# Altium footprint library ACTION_Others.pcblib: 88 footprints (part 5 of 6)
Each footprint in its own frame and in the unit in brackets; x right, y up, seen from the top. Pads: shape width x height; smd on the part's side, far side on the other; paste and mask are expansions set on the pad; w line width, h text height; cw(c..) or ccw(c..) is an arc to the next point about the centre after c.
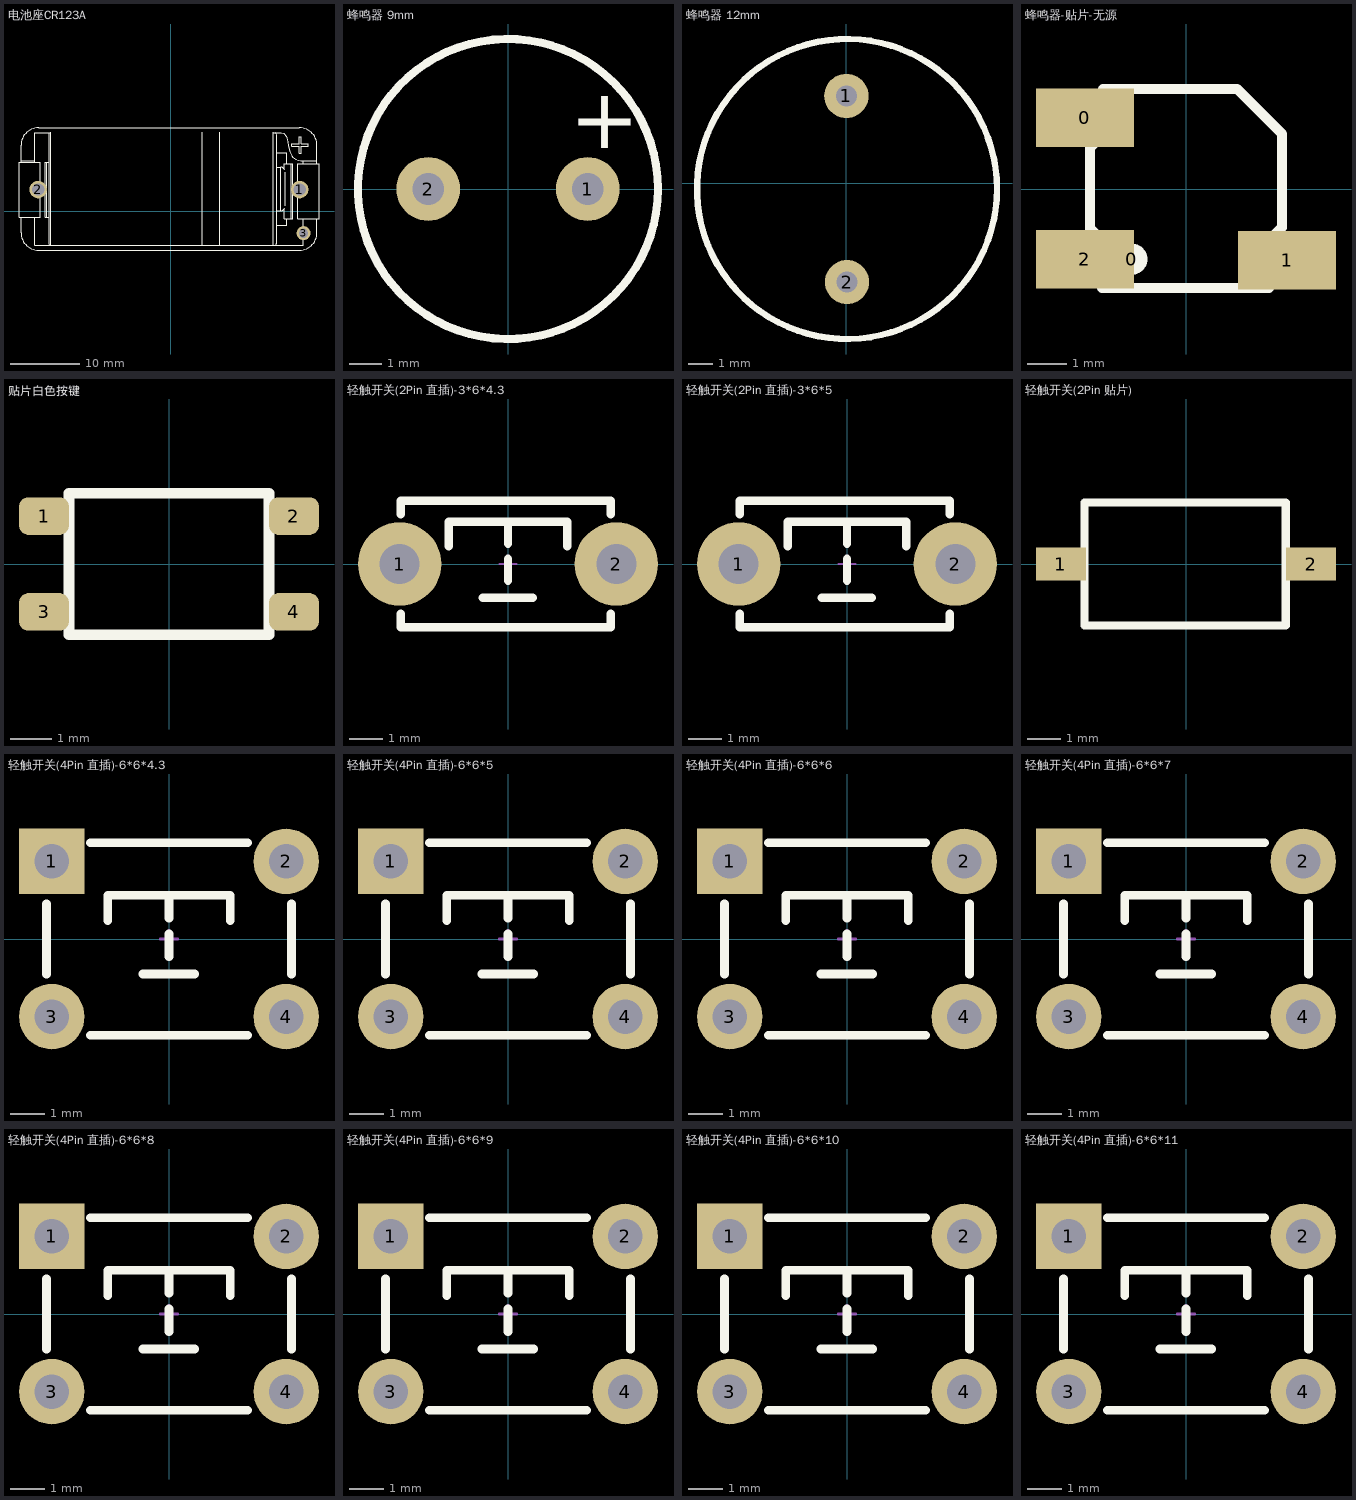
[diagram p4: the footprints below, top view; thin cyan lines are the x and y axes]

## 电池座CR123A [mil]
pads (3):
  round 100 hole 70: 1(736,124.5) 2(-758,124.5)
  round 80 hole 53: 3(758,-124.5)
Top Overlay:
  lines w2.13: -855.83,-33.25 -855.83,-122.24 ccw(c-755.83,-122.24) -755.83,-222.24 734.17,-222.24 ccw(c734.17,-122.24) 834.17,-122.24 834.17,-42.06 ; -855.83,281.71 -855.83,289.53 ; -777.09,-33.25 -777.09,-194.68 755.43,-194.68 755.43,-42.06 ; -777.09,281.71 -777.09,289.53 ; -695.79,-189.56 ccw(c-685.79,-189.56) -694.38,-194.68 ; -695.79,-188.34 -695.79,445.44 cw(c-685.79,445.44) -694.59,450.2 ; -695.79,-33.25 -710.23,-33.25 ; -695.79,281.71 -710.23,281.71 ; -688.43,450.2 -777.09,450.2 -777.09,289.53 ; -685.79,-194.68 -685.79,450.56 ; 179.21,-194.68 179.21,450.56 ; 279.21,-194.68 279.21,450.56 ; 584.21,-194.68 584.21,450.56 ; 587.96,450.2 630.12,450.2 643.3,445.11 649.03,440.86 653.89,435.62 658.53,428.24 661.99,420.21 667.88,398.32 671.65,375.83 675.7,353.41 679.04,340.54 683.73,328.13 688.92,318.82 695.56,310.49 703.64,303.49 712.81,297.96 726.4,292.74 740.67,289.66 755.43,288.19 ; 597.3,-194.68 ccw(c584.21,-179.56) 604.21,-179.56 ; 597.7,450.2 cw(c584.21,435.44) 604.21,435.44 604.21,-178.38 ; 604.21,-78.97 660.78,-78.97 660.78,-42.06 ; 604.21,2.94 627.21,2.94 ; 604.21,252.94 627.21,252.94 ; 604.21,334.49 660.78,334.49 660.78,272.9 ; 648.81,-42.06 648.81,16.33 ; 648.81,239.76 648.81,272.9 ; 648.86,-42.06 688.57,-42.06 ; 649,272.9 688.57,272.9 ; 650.26,18.26 cw(c627.21,27.94) 627.21,2.94 ; 650.26,237.63 ccw(c627.21,227.94) 627.21,252.94 ; 652.21,31.88 652.21,223.97 ; 755.43,272.9 755.43,289.53 834.17,289.53 ; 834.17,272.9 834.17,289.53 ; -855.83,289.53 -777.09,289.53 ; -855.83,289.53 -855.83,377.76 cw(c-755.83,377.76) -755.83,477.76 734.17,477.76 cw(c734.17,377.76) 834.17,377.76 834.17,289.53 ; -710.23,-33.25 -710.23,281.71 ; -710.23,-33.25 -719.01,-33.25 -719.01,281.71 -710.23,281.71 ; 627.21,2.94 627.21,252.94 ; 688.57,-42.06 688.57,272.9 ; 688.57,-42.06 697.35,-42.06 697.35,272.9 688.57,272.9 ; -867.64,-33.25 -867.64,281.71 -746.11,281.71 -746.11,-33.25 -867.64,-33.25 ; 691.75,373.2 691.75,385.56 732.38,385.56 732.38,426.2 744.75,426.2 744.75,385.56 785.38,385.56 785.38,373.2 744.75,373.2 744.75,332.57 732.38,332.57 732.38,373.2 691.75,373.2 ; 724.45,-42.06 724.45,272.9 845.98,272.9 845.98,-42.06 724.45,-42.06
3D body: height 10, standoff 0, extent -21,125.5 -21,125.5
3D body "User Library-BH123A_assembly-1.STEP": height 694, standoff -158.38, extent -868.81,-224.5 844.81,475.5

## 蜂鸣器 9mm [mm]
height 5
pads (2):
  round 2 hole 1: 1(2.5,0) 2(-2.5,0)
Top Overlay:
  circle w0.254: c0,0 r4.7
  text "+" at 1.93,1.27 h1.91
3D body "BUZZER-短引脚9.6MM.stp": height 5.12, standoff -5.38, extent -4.825,-4.775 4.775,4.818

## 蜂鸣器 12mm [mil]
pads (2):
  round 70 hole 33.46: 1(0,138) 2(1,-156)
Top Overlay:
  circle w10: c1,-9 r237
3D body "蜂鸣器修改.STEP": height 362.2, standoff -78.74, extent -232.59,-244.71 240.46,228.35

## 蜂鸣器-贴片-无源 [mm]
pads (4):
  rect 2.5x1.5 smd: 0(-2.578,1.816) 1(2.578,-1.816) 2(-2.578,-1.791)
  round 0.8 on Top Overlay: 0(-1.384,-1.791)
Top Overlay:
  lines w0.254: -2.451,-1.029 -2.451,1.054 -2.121,1.384 ; -2.451,-1.003 -2.146,-1.308 ; -2.146,-1.359 -2.146,-2.527 2.121,-2.527 2.121,-1.308 2.451,-0.978 2.451,1.105 ; -2.121,1.41 -2.121,2.553 1.308,2.553 2.451,1.41 2.451,1.206 ; 2.451,1.13 2.451,1.232

## 贴片白色按键 [mm]
pads (4):
  rrect50% 1.2x0.9 smd: 1(-3,1.15) 2(3,1.15) 3(-3,-1.15) 4(3,-1.15)
Top Overlay:
  lines w0.254: -2.4,-1.7 2.4,-1.7 2.4,1.7 -2.4,1.7 -2.4,-1.7
3D body: height 2.5, standoff 0, extent -2.413,-1.702 2.413,1.702

## 轻触开关(2Pin 直插)-3*6*4.3 [mm] "3*6*4.3mm"
height 4.3
pads (2):
  round 2.5 hole 1.2: 1(-3.25,0) 2(3.25,0)
Top Overlay:
  lines w0.254: -3.212,-1.499 -3.212,-1.9 3.088,-1.9 3.088,-1.499 ; -3.212,1.499 -3.212,1.9 3.088,1.9 3.088,1.499 ; -1.778,0.533 -1.778,1.27 1.778,1.27 1.778,0.533 ; -0.762,-1.016 0.737,-1.016 ; 0,-0.508 0,0.152 ; 0,0.61 0,1.27
Mechanical 15:
  lines w0.051: -0.254,0 0.254,0 ; 0,-0.254 0,0.254
3D body "TSW DIP-3x6x4.3.STEP": height 4.31, standoff -3.49, extent -3.914,-1.75 3.914,1.75

## 轻触开关(2Pin 直插)-3*6*5 [mm] "3*6*5mm"
height 5
pads (2):
  round 2.5 hole 1.2: 1(-3.25,0) 2(3.25,0)
Top Overlay:
  lines w0.254: -3.212,-1.499 -3.212,-1.9 3.088,-1.9 3.088,-1.499 ; -3.212,1.499 -3.212,1.9 3.088,1.9 3.088,1.499 ; -1.778,0.533 -1.778,1.27 1.778,1.27 1.778,0.533 ; -0.762,-1.016 0.737,-1.016 ; 0,-0.508 0,0.152 ; 0,0.61 0,1.27
Mechanical 15:
  lines w0.051: -0.254,0 0.254,0 ; 0,-0.254 0,0.254
3D body "TSW DIP-3x6x5.STEP": height 5.01, standoff -3.49, extent -3.914,-1.75 3.914,1.75

## 轻触开关(2Pin 贴片) [mm]
pads (2):
  rect 1.5x1 smd: 1(-3.772,0) 2(3.772,0)
Top Overlay:
  lines w0.254: -3.061,-1.854 3.01,-1.854 3.01,1.854 -3.061,1.854 -3.061,-1.854
3D body "User Library-KEY_SOT_P2.STEP": height 2.49, standoff 0.1, extent -4.111,-1.805 4.029,1.795

## 轻触开关(4Pin 直插)-6*6*4.3 [mm]
height 4.3
pads (4):
  rect 1.9x1.9 hole 1: 1(-3.4,2.25)
  round 1.9 hole 1: 2(3.4,2.25) 3(-3.4,-2.25) 4(3.4,-2.25)
Top Overlay:
  lines w0.254: -3.556,-1.016 -3.556,1.016 ; -2.286,-2.794 2.286,-2.794 ; -2.286,2.794 2.286,2.794 ; -1.778,0.533 -1.778,1.27 1.778,1.27 1.778,0.533 ; -0.762,-1.016 0.737,-1.016 ; 0,-0.508 0,0.152 ; 0,0.61 0,1.27 ; 3.556,-1.016 3.556,1.016
Mechanical 15:
  lines w0.076: -0.254,0 0.254,0 ; 0,-0.254 0,0.254
3D body "TSW DIP-6x6x4.3.STEP": height 4.25, standoff -3.45, extent -4.106,-3 4.106,3

## 轻触开关(4Pin 直插)-6*6*5 [mm] "6*6*5mm"
height 5
pads (4):
  rect 1.9x1.9 hole 1: 1(-3.4,2.25)
  round 1.9 hole 1: 2(3.4,2.25) 3(-3.4,-2.25) 4(3.4,-2.25)
Top Overlay:
  lines w0.254: -3.556,-1.016 -3.556,1.016 ; -2.286,-2.794 2.286,-2.794 ; -2.286,2.794 2.286,2.794 ; -1.778,0.533 -1.778,1.27 1.778,1.27 1.778,0.533 ; -0.762,-1.016 0.737,-1.016 ; 0,-0.508 0,0.152 ; 0,0.61 0,1.27 ; 3.556,-1.016 3.556,1.016
Mechanical 15:
  lines w0.076: -0.254,0 0.254,0 ; 0,-0.254 0,0.254
3D body "TSW DIP-6x6x5.STEP": height 4.95, standoff -3.45, extent -4.106,-3 4.106,3

## 轻触开关(4Pin 直插)-6*6*6 [mm] "6*6*6mm"
height 6
pads (4):
  rect 1.9x1.9 hole 1: 1(-3.4,2.25)
  round 1.9 hole 1: 2(3.4,2.25) 3(-3.4,-2.25) 4(3.4,-2.25)
Top Overlay:
  lines w0.254: -3.556,-1.016 -3.556,1.016 ; -2.286,-2.794 2.286,-2.794 ; -2.286,2.794 2.286,2.794 ; -1.778,0.533 -1.778,1.27 1.778,1.27 1.778,0.533 ; -0.762,-1.016 0.737,-1.016 ; 0,-0.508 0,0.152 ; 0,0.61 0,1.27 ; 3.556,-1.016 3.556,1.016
Mechanical 15:
  lines w0.076: -0.254,0 0.254,0 ; 0,-0.254 0,0.254
3D body "TSW DIP-6x6x6.STEP": height 5.95, standoff -3.45, extent -4.106,-3 4.106,3

## 轻触开关(4Pin 直插)-6*6*7 [mm] "6*6*7mm"
height 7
pads (4):
  rect 1.9x1.9 hole 1: 1(-3.4,2.25)
  round 1.9 hole 1: 2(3.4,2.25) 3(-3.4,-2.25) 4(3.4,-2.25)
Top Overlay:
  lines w0.254: -3.556,-1.016 -3.556,1.016 ; -2.286,-2.794 2.286,-2.794 ; -2.286,2.794 2.286,2.794 ; -1.778,0.533 -1.778,1.27 1.778,1.27 1.778,0.533 ; -0.762,-1.016 0.737,-1.016 ; 0,-0.508 0,0.152 ; 0,0.61 0,1.27 ; 3.556,-1.016 3.556,1.016
Mechanical 15:
  lines w0.076: -0.254,0 0.254,0 ; 0,-0.254 0,0.254
3D body "TSW DIP-6x6x7.STEP": height 6.95, standoff -3.45, extent -4.106,-3 4.106,3

## 轻触开关(4Pin 直插)-6*6*8 [mm] "6*6*8mm"
height 8
pads (4):
  rect 1.9x1.9 hole 1: 1(-3.4,2.25)
  round 1.9 hole 1: 2(3.4,2.25) 3(-3.4,-2.25) 4(3.4,-2.25)
Top Overlay:
  lines w0.254: -3.556,-1.016 -3.556,1.016 ; -2.286,-2.794 2.286,-2.794 ; -2.286,2.794 2.286,2.794 ; -1.778,0.533 -1.778,1.27 1.778,1.27 1.778,0.533 ; -0.762,-1.016 0.737,-1.016 ; 0,-0.508 0,0.152 ; 0,0.61 0,1.27 ; 3.556,-1.016 3.556,1.016
Mechanical 15:
  lines w0.076: -0.254,0 0.254,0 ; 0,-0.254 0,0.254
3D body "TSW DIP-6x6x8.STEP": height 7.95, standoff -3.45, extent -4.106,-3 4.106,3

## 轻触开关(4Pin 直插)-6*6*9 [mm] "6*6*9mm"
height 9
pads (4):
  rect 1.9x1.9 hole 1: 1(-3.4,2.25)
  round 1.9 hole 1: 2(3.4,2.25) 3(-3.4,-2.25) 4(3.4,-2.25)
Top Overlay:
  lines w0.254: -3.556,-1.016 -3.556,1.016 ; -2.286,-2.794 2.286,-2.794 ; -2.286,2.794 2.286,2.794 ; -1.778,0.533 -1.778,1.27 1.778,1.27 1.778,0.533 ; -0.762,-1.016 0.737,-1.016 ; 0,-0.508 0,0.152 ; 0,0.61 0,1.27 ; 3.556,-1.016 3.556,1.016
Mechanical 15:
  lines w0.076: -0.254,0 0.254,0 ; 0,-0.254 0,0.254
3D body "TSW DIP-6x6x9.STEP": height 8.95, standoff -3.45, extent -4.106,-3 4.106,3

## 轻触开关(4Pin 直插)-6*6*10 [mm] "6*6*10mm"
height 10
pads (4):
  rect 1.9x1.9 hole 1: 1(-3.4,2.25)
  round 1.9 hole 1: 2(3.4,2.25) 3(-3.4,-2.25) 4(3.4,-2.25)
Top Overlay:
  lines w0.254: -3.556,-1.016 -3.556,1.016 ; -2.286,-2.794 2.286,-2.794 ; -2.286,2.794 2.286,2.794 ; -1.778,0.533 -1.778,1.27 1.778,1.27 1.778,0.533 ; -0.762,-1.016 0.737,-1.016 ; 0,-0.508 0,0.152 ; 0,0.61 0,1.27 ; 3.556,-1.016 3.556,1.016
Mechanical 15:
  lines w0.076: -0.254,0 0.254,0 ; 0,-0.254 0,0.254
3D body "TSW DIP-6x6x10.STEP": height 9.95, standoff -3.45, extent -4.106,-3 4.106,3

## 轻触开关(4Pin 直插)-6*6*11 [mm] "6*6*11mm"
height 11
pads (4):
  rect 1.9x1.9 hole 1: 1(-3.4,2.25)
  round 1.9 hole 1: 2(3.4,2.25) 3(-3.4,-2.25) 4(3.4,-2.25)
Top Overlay:
  lines w0.254: -3.556,-1.016 -3.556,1.016 ; -2.286,-2.794 2.286,-2.794 ; -2.286,2.794 2.286,2.794 ; -1.778,0.533 -1.778,1.27 1.778,1.27 1.778,0.533 ; -0.762,-1.016 0.737,-1.016 ; 0,-0.508 0,0.152 ; 0,0.61 0,1.27 ; 3.556,-1.016 3.556,1.016
Mechanical 15:
  lines w0.076: -0.254,0 0.254,0 ; 0,-0.254 0,0.254
3D body "TSW DIP-6x6x11.STEP": height 10.95, standoff -3.45, extent -4.106,-3 4.106,3